# Altium footprint library Gate Driver Board.PcbLib: 123 footprints (part 4 of 8)
Each footprint in its own frame and in the unit in brackets; x right, y up, seen from the top. Pads: shape width x height; smd on the part's side, far side on the other; paste and mask are expansions set on the pad; w line width, h text height; cw(c..) or ccw(c..) is an arc to the next point about the centre after c.
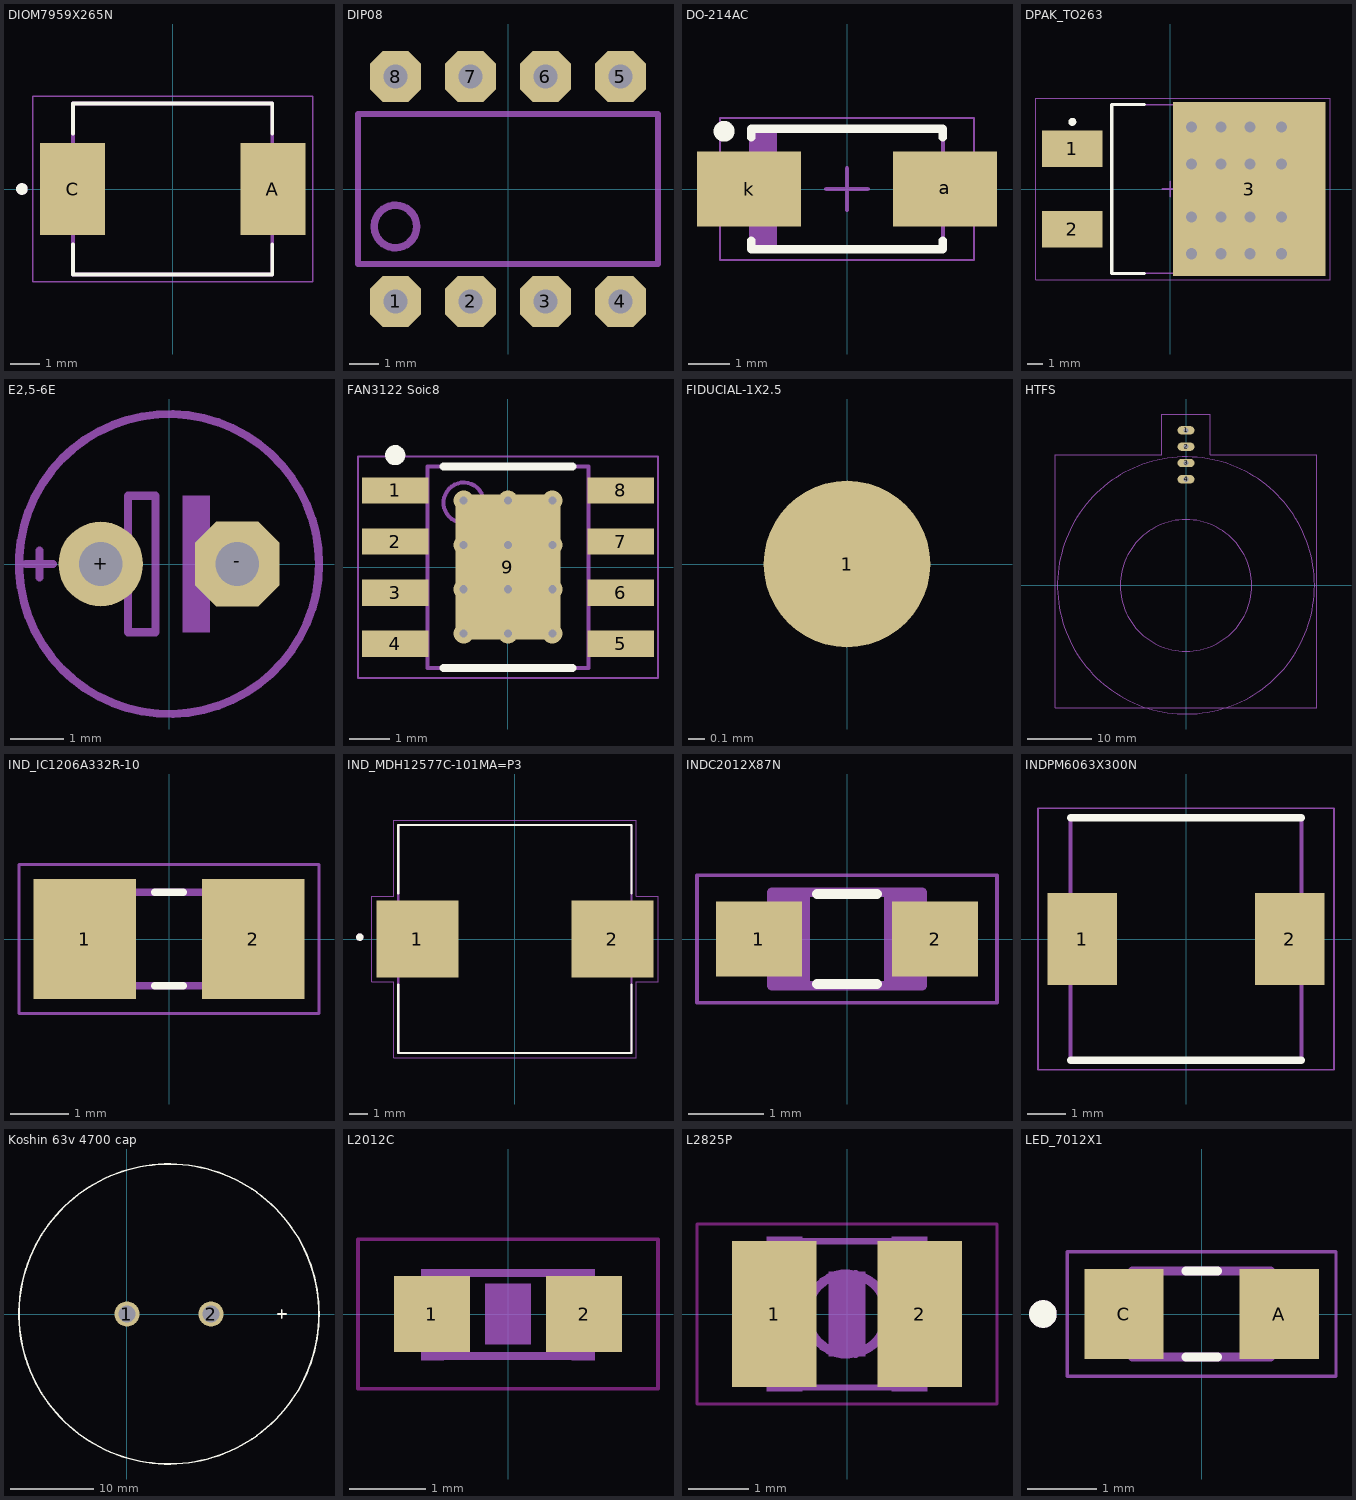
[diagram p3: the footprints below, top view; thin cyan lines are the x and y axes]

## DIOM7959X265N [mm]
pads (2):
  rect 2.25x3.18 smd: A(3.455,0) C(-3.455,0)
Top Overlay:
  circle w0.2: c-5.2,0 r0.1
  lines w0.127: -3.437,-1.91 -3.437,-2.95 3.437,-2.95 3.437,-1.91 ; -3.437,1.91 -3.437,2.95 3.437,2.95 3.437,1.91
Mechanical 13:
  circle w0.2: c-5.2,0 r0.1
  lines w0.127: -3.437,-2.95 3.437,-2.95 3.437,2.95 -3.437,2.95 -3.437,-2.95
Mechanical 15:
  lines w0.05: -4.83,-3.2 -4.83,3.2 4.83,3.2 4.83,-3.2 -4.83,-3.2
3D body "SK54.STEP": height 2.62, standoff 0, extent -4.097,-2.952 3.843,2.952

## DIP08 [mil] "DIP08"
pads (8):
  oct 68x68 / inner round 0 / far side oct 68x68 hole 32: 1(-150,-150) 2(-50,-150) 3(50,-150) 4(150,-150) 5(150,150) 6(50,150) 7(-50,150) 8(-150,150)
3D Body Bottom:
  circle w10: c-150,-50 r28.28
  lines w8: -200,-40 -200,-60 ; -200,-60 -200,-100 200,-100 200,100 -200,100 -200,-60
3D body: height 50, standoff 0, extent -181.68,118.32 -118.32,181.68
3D body: height 50, standoff 0, extent -81.68,118.32 -18.32,181.68
3D body: height 50, standoff 0, extent 18.32,118.32 81.68,181.68
3D body: height 50, standoff 0, extent 118.32,118.32 181.68,181.68
3D body: height 50, standoff 0, extent 118.32,-181.68 181.68,-118.32
3D body: height 50, standoff 0, extent 18.32,-181.68 81.68,-118.32
3D body: height 50, standoff 0, extent -81.68,-181.68 -18.32,-118.32
3D body: height 50, standoff 0, extent -181.68,-181.68 -118.32,-118.32

## DO-214AC [mm]
height 1.35
pads (2):
  rect 2.5x1.8 smd: a(2.35,0) k(-2.35,0)
Top Overlay:
  circle w0.25: c-2.95,1.385 r0.125
  lines w0.2: -2.3,-1.235 -2.3,-1.45 2.3,-1.45 2.3,-1.235 ; -2.3,1.235 -2.3,1.45 2.3,1.45 2.3,1.235
Assembly Top:
  rectangle: -2.3,-1.45 -1.681,1.45
  lines w0.1: -2.3,-1.45 2.3,-1.45 2.3,1.45 -2.3,1.45 -2.3,-1.45
Courtyard Top:
  lines w0.05: -3.05,-1.7 3.05,-1.7 3.05,1.7 -3.05,1.7 -3.05,-1.7
  lines w0.1: -0.5,0 0.5,0 ; 0,-0.5 0,0.5
3D body "User Library-DO-214AC(SMA).STEP": height 2.3, standoff 0.01, extent -2.768,-1.422 2.718,1.372

## DPAK_TO263 [mm] "D2-PAK, 3-Pads, Body 7.93x8.70mm (max), IPC Medium Density"
height 4.8
pads (3):
  rect 3.81x2.32 smd: 1(-6.2,2.54) 2(-6.2,-2.54)
  rect 9.65x11 smd: 3(5,0)
via 7.05,-4.1 diameter 1.27 hole 0.711
via 5.05,-4.1 diameter 1.27 hole 0.711
via 3.225,-4.1 diameter 1.27 hole 0.711
via 1.35,-4.1 diameter 1.27 hole 0.711
via 7.05,-1.775 diameter 1.27 hole 0.711
via 5.05,-1.775 diameter 1.27 hole 0.711
via 3.225,-1.775 diameter 1.27 hole 0.711
via 1.35,-1.775 diameter 1.27 hole 0.711
via 7.05,1.575 diameter 1.27 hole 0.711
via 5.05,1.575 diameter 1.27 hole 0.711
via 3.225,1.575 diameter 1.27 hole 0.711
via 1.35,1.575 diameter 1.27 hole 0.711
via 7.05,3.925 diameter 1.27 hole 0.711
via 5.05,3.925 diameter 1.27 hole 0.711
via 3.225,3.925 diameter 1.27 hole 0.711
via 1.35,3.925 diameter 1.27 hole 0.711
Top Overlay:
  circle w0.25: c-6.2,4.25 r0.125
  lines w0.2: -1.625,-5.35 -3.7,-5.35 -3.7,5.35 -1.625,5.35
Assembly Top:
  lines w0.1: -3.7,-5.325 -3.7,5.325 5.95,5.325 5.95,-5.325 -3.7,-5.325
Courtyard Top:
  lines w0.05: -8.5,-5.75 -8.5,5.75 10.125,5.75 10.125,-5.75 -8.5,-5.75
  lines w0.1: -0.5,0 0.5,0 ; 0,-0.5 0,0.5
3D body "User Library-TO263-3S.STEP": height 4.81, standoff 0.01, extent -7.515,-4.975 8.155,5.025

## E2,5-6E [mil] "E2,5-6E"
pads (2):
  round 62 / inner round 0 / far side round 62 hole 32: +(-50,0)
  oct 62x62 / inner round 0 / far side oct 62x62 hole 32: -(50,0)
Assembly Bottom:
  region: 10,-50 10,50 30,50 30,-50
  lines w6: -65,0 -30,0 ; 25,0 65,0 ; -30,0 -30,-50 -10,-50 -10,50 -30,50 -30,0
3D Body Bottom:
  circle w6: c0,0 r110
  lines w6: -105,0 -85,0 ; -95,-10 -95,10
3D body: height 150, standoff 0, extent -68.25,-3.25 -26.75,3.25
3D body: height 150, standoff 0, extent -33.25,-53.25 -26.75,3.25
3D body: height 150, standoff 0, extent -33.25,-53.25 -6.75,-46.75
3D body: height 150, standoff 0, extent -13.25,-53.25 -6.75,53.25
3D body: height 150, standoff 0, extent -33.25,46.75 -6.75,53.25
3D body: height 150, standoff 0, extent -33.25,-3.25 -26.75,53.25
3D body: height 150, standoff 0, extent 21.75,-3.25 68.25,3.25
3D body: height 150, standoff 0, extent 10,-50 30,50
3D body: height 50, standoff 0, extent 21.11,-28.89 78.89,28.89
3D body: height 50, standoff 0, extent -81.27,-31.27 -18.73,31.27

## FAN3122 Soic8 [mm] "SOIC, 8-Leads, Body 4.95x3.95mm, Pitch 1.27mm, Thermal Pad 4.10x3.10mm, IPC Medium Density"
height 1.75
pads (9):
  rect 1.65x0.65 smd: 1(-2.8,1.905) 2(-2.8,0.635) 3(-2.8,-0.635) 4(-2.8,-1.905) 5(2.8,-1.905) 6(2.8,-0.635) 7(2.8,0.635) 8(2.8,1.905)
  rect 2.6x3.6 smd: 9(0,0)
via -1.1,1.65 diameter 0.5 hole 0.2
via 0,1.65 diameter 0.5 hole 0.2
via 1.1,1.65 diameter 0.5 hole 0.2
via -1.1,0.55 diameter 0.5 hole 0.2
via 0,0.55 diameter 0.5 hole 0.2
via 1.1,0.55 diameter 0.5 hole 0.2
via -1.1,-0.55 diameter 0.5 hole 0.2
via 0,-0.55 diameter 0.5 hole 0.2
via 1.1,-0.55 diameter 0.5 hole 0.2
via -1.1,-1.65 diameter 0.5 hole 0.2
via 0,-1.65 diameter 0.5 hole 0.2
via 1.1,-1.65 diameter 0.5 hole 0.2
Top Overlay:
  circle w0.25: c-2.8,2.78 r0.125
  lines w0.2: -1.6,-2.5 1.6,-2.5 ; -1.6,2.5 1.6,2.5
Assembly Top:
  circle w0.1: c-1.1,1.6 r0.5
  lines w0.1: -2,-2.5 -2,2.5 2,2.5 2,-2.5 -2,-2.5
Courtyard Top:
  lines w0.05: -3.725,-2.75 -3.725,2.75 3.725,2.75 3.725,-2.75 -3.725,-2.75
  lines w0.1: -0.5,0 0.5,0 ; 0,-0.5 0,0.5
3D body "User Library-SOIC8_JEDEC_MS-012AA.STEP": height 1.66, standoff -0.09, extent -3.124,-2.55 3.075,2.45

## FIDUCIAL-1X2.5 [mm] "FIDUCIAL-1X2.5"
pads (1):
  rrect100% 1x1 smd paste+0: 1(0,0)
Top Solder:
  circle w1.27: c0,0 r0.9

## HTFS [mil] "HTFS"
pads (4):
  oval 103x51.5 / inner round 0 / far side oval 103x51.5 hole 31.5: 1(0,950) 2(0,850) 3(0,750) 4(0,650)
3D Body Bottom:
  circle w5: c0,0 r403.11
  circle w5: c0,0 r787.4
  lines w5: -800,-750 -800,800 -150,800 -150,1050 150,1050 150,800 800,800 800,-750 -800,-750
3D body: height 50, standoff 0, extent -51.72,624.03 51.72,675.97
3D body: height 50, standoff 0, extent -51.72,724.03 51.72,775.97
3D body: height 50, standoff 0, extent -51.72,824.03 51.72,875.97
3D body: height 50, standoff 0, extent -51.72,924.03 51.72,975.97

## IND_IC1206A332R-10 [mm]
pads (2):
  rect 1.76x2.06 smd: 1(-1.445,0) 2(1.445,0)
Top Overlay:
  lines w0.127: -0.245,-0.8 0.245,-0.8 ; -0.245,0.8 0.245,0.8
Mechanical 13:
  lines w0.127: -1.6,-0.8 1.6,-0.8 1.6,0.8 -1.6,0.8 -1.6,-0.8
Mechanical 15:
  lines w0.05: -2.575,-1.28 2.575,-1.28 2.575,1.28 -2.575,1.28 -2.575,-1.28
3D body "step_temp.STEP": height 1.4, standoff 0, extent -1.6,-0.8 1.6,0.8

## IND_MDH12577C-101MA=P3 [mm]
pads (2):
  rect 4.5x4.2 smd: 1(-5.35,0) 2(5.35,0)
Top Overlay:
  circle w0.2: c-8.505,0.1 r0.1
  lines w0.127: -6.4,-2.5 -6.4,-6.25 6.4,-6.25 6.4,-2.5 ; -6.4,2.5 -6.4,6.25 6.4,6.25 6.4,2.5
Mechanical 13:
  circle w0.2: c-8.505,0.1 r0.1
  lines w0.127: -6.4,-6.25 -6.4,6.25 6.4,6.25 6.4,-6.25 -6.4,-6.25
Mechanical 15:
  lines w0.05: -7.85,-2.35 -7.85,2.35 -6.65,2.35 -6.65,6.5 6.65,6.5 6.65,2.35 7.85,2.35 7.85,-2.35 6.65,-2.35 6.65,-6.5 -6.65,-6.5 -6.65,-2.35 -7.85,-2.35
3D body "MDH12577C-101MA=P3.STEP": height 8, standoff 0, extent -6.358,-6.278 6.442,6.222

## INDC2012X87N [mm]
pads (2):
  rect 1.15x1 smd: 1(-1.175,0) 2(1.175,0)
Top Overlay:
  lines w0.127: -0.4,-0.6 0.4,-0.6 ; -0.4,0.6 0.4,0.6
Mechanical 13:
  region: -0.5,-0.625 -1,-0.625 -1,0.625 -0.5,0.625
  region: 1,-0.625 0.5,-0.625 0.5,0.625 1,0.625
  lines w0.127: -1,-0.625 1,-0.625 1,0.625 -1,0.625 -1,-0.625
Mechanical 15:
  lines w0.051: -2,-0.85 2,-0.85 2,0.85 -2,0.85 -2,-0.85
3D body "MLZ2012M100HTD25.STEP": height 1.03, standoff -0.02, extent -1,-0.625 1,0.625

## INDPM6063X300N [mm]
pads (2):
  rect 1.8x2.4 smd: 1(-2.7,0) 2(2.7,0)
Top Overlay:
  lines w0.2: -3,-3.15 3,-3.15 ; -3,3.15 3,3.15
Mechanical 13:
  lines w0.1: -3,-3.15 -3,3.15 3,3.15 3,-3.15 -3,-3.15
Mechanical 15:
  lines w0.05: -3.85,-3.4 -3.85,3.4 3.85,3.4 3.85,-3.4 -3.85,-3.4
3D body "B82462G4333M000.stp": height 3, standoff 0, extent -3,-3.15 3,3.15

## Koshin 63v 4700 cap [mm]
pads (2):
  round 3 hole 2: 1(0,0) 2(10.1,0)
Top Overlay:
  circle w0.2: c5.05,0 r18
  lines w0.2: 18.082,0 19.098,0 ; 18.59,-0.508 18.59,0.508
3D body "Snap-Cap 35mm W x 50mm H 10mm pitch.step": height 50, standoff -6.2, extent -12.571,-17.421 22.425,17.575

## L2012C [mm] "L2012C"
pads (2):
  rect 1x1 smd: 1(-1,0) 2(1,0)
Top Layer keep-out:
  lines w0.051: -1.973,-0.983 -1.973,0.983 1.973,0.983 1.973,-0.983 -1.973,-0.983
Assembly Bottom:
  region: 0.838,-0.61 0.838,0.59 1.138,0.59 1.138,-0.61
  region: -1.143,-0.61 -1.143,0.59 -0.843,0.59 -0.843,-0.61
  lines w0.102: -0.864,-0.553 0.864,-0.553 ; -0.864,0.54 0.864,0.54
Top Glue Points:
  region: -0.3,-0.4 -0.3,0.4 0.3,0.4 0.3,-0.4

## L2825P [mm] "L2825P"
pads (2):
  rect 1.4x2.4 smd: 1(-1.2,0) 2(1.2,0)
Top Layer keep-out:
  lines w0.051: -2.473,-1.483 -2.473,1.483 2.473,1.483 2.473,-1.483 -2.473,-1.483
Assembly Bottom:
  circle w0.152: c0,0 r0.66
  region: -1.321,-1.27 -1.321,1.27 -0.737,1.27 -0.737,-1.27
  region: 0.737,-1.27 0.737,1.27 1.321,1.27 1.321,-1.27
  lines w0.102: -1.34,-0.965 -1.34,0.965 ; -0.762,-1.213 0.762,-1.213 ; -0.762,1.2 0.762,1.2 ; 1.34,-0.965 1.34,0.965
Top Glue Points:
  region: -0.3,-0.7 -0.3,0.7 0.3,0.7 0.3,-0.7

## LED_7012X1 [mm]
pads (2):
  rect 1.15x1.3 smd: A(1.125,0) C(-1.125,0)
Top Overlay:
  circle w0.2: c-2.3,0 r0.1
  lines w0.127: -0.23,-0.625 0.23,-0.625 ; -0.23,0.625 0.23,0.625
Mechanical 13:
  circle w0.2: c-2.3,0 r0.1
  lines w0.127: -1,-0.625 -1,0.625 1,0.625 1,-0.625 -1,-0.625
Mechanical 15:
  lines w0.05: -1.95,-0.9 -1.95,0.9 1.95,0.9 1.95,-0.9 -1.95,-0.9
3D body "7012X1--3DModel-STEP-1.STEP": height 0.73, standoff 0, extent -1.003,-0.622 1.003,0.622